# Altium footprint library Kintex_SDR.PcbLib: 72 footprints (part 5 of 5)
Each footprint in its own frame and in the unit in brackets; x right, y up, seen from the top. Pads: shape width x height; smd on the part's side, far side on the other; paste and mask are expansions set on the pad; w line width, h text height; cw(c..) or ccw(c..) is an arc to the next point about the centre after c.
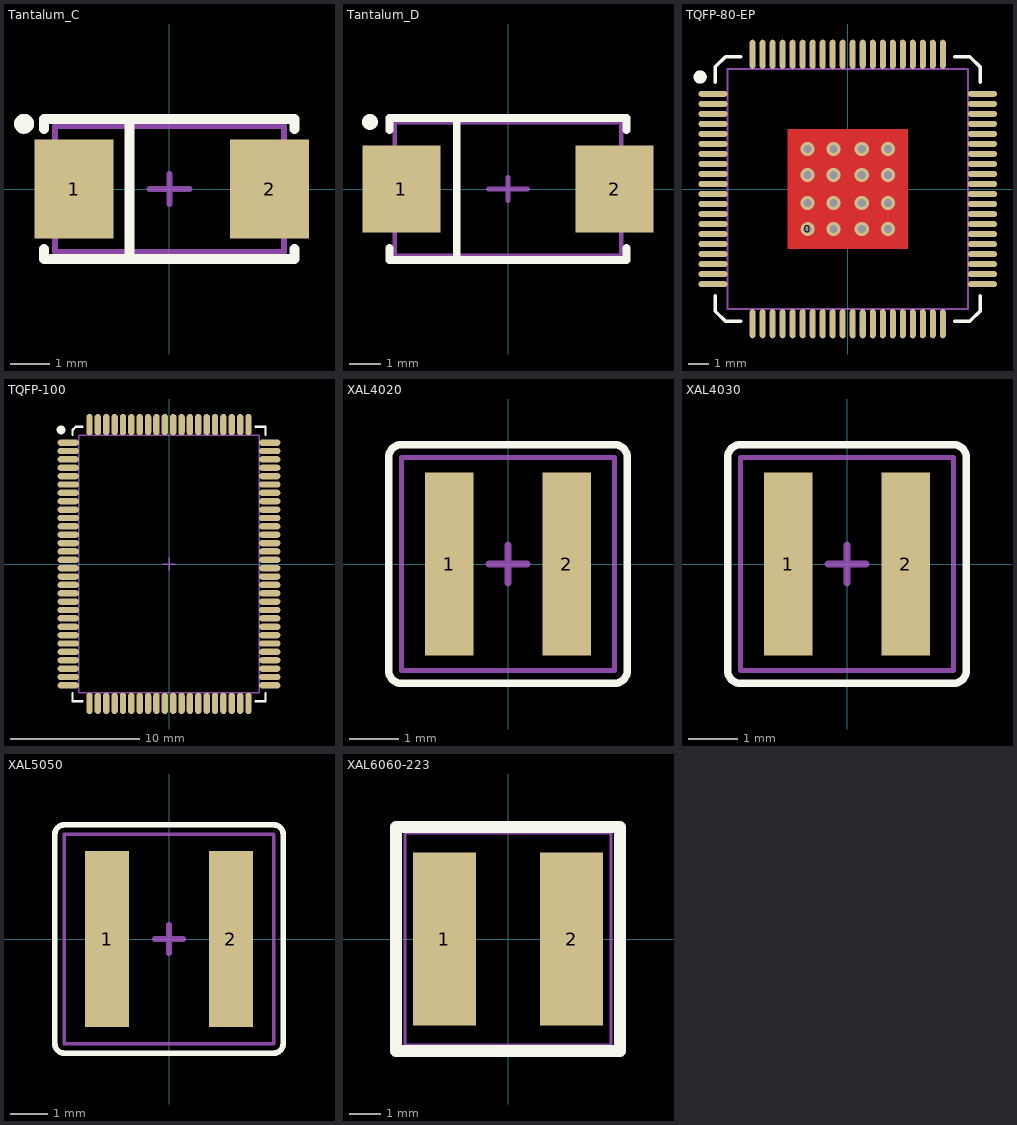
[diagram p4: the footprints below, top view; thin cyan lines are the x and y axes]

## Tantalum_C [mm]
height 2
pads (2):
  rect 2x2.5 smd: 1(-2.413,0) 2(2.54,0)
Top Overlay:
  circle w0.254: c-3.683,1.651 r0.127
  lines w0.254: -3.175,-1.524 -3.175,-1.778 3.175,-1.778 3.175,-1.524 ; -3.175,1.524 -3.175,1.778 3.175,1.778 3.175,1.524 ; -1.016,-1.651 -1.016,1.651
Mechanical 1:
  lines w0.15: -0.508,0 0.508,0 ; 0,-0.381 0,0.381 ; -2.9,-1.6 2.9,-1.6 2.9,1.6 -2.9,1.6 -2.9,-1.6
3D body "User Library-Tantalum Size C.step": height 2.6, standoff 0, extent -2.9,-1.6 2.9,1.6

## Tantalum_D [mm]
height 2
pads (2):
  rect 2.5x2.8 smd: 1(-3.429,0) 2(3.429,0)
Top Overlay:
  circle w0.254: c-4.445,2.159 r0.127
  lines w0.254: -3.81,-1.905 -3.81,-2.286 3.81,-2.286 3.81,-1.905 ; -3.81,1.905 -3.81,2.286 3.81,2.286 3.81,1.905 ; -1.651,-2.286 -1.651,2.286
Mechanical 1:
  lines w0.15: -0.635,0 0.635,0 ; 0,-0.381 0,0.381 ; -3.65,-2.15 3.65,-2.15 3.65,2.15 -3.65,2.15 -3.65,-2.15
3D body "User Library-CaseD_7343-31.step": height 2.8, standoff 0, extent -3.65,-2.15 3.65,2.15

## TQFP-80-EP [mm] "TQFP, 80-Leads"
height 1.05
pads (81):
  round 0.7 hole 0.4: 0(-2,-2)
  oval 1.45x0.3 smd: 1(-6.725,4.75) 2(-6.725,4.25) 3(-6.725,3.75) 4(-6.725,3.25) 5(-6.725,2.75) 6(-6.725,2.25) 7(-6.725,1.75) 8(-6.725,1.25) 9(-6.725,0.75) 10(-6.725,0.25) 11(-6.725,-0.25) 12(-6.725,-0.75) 13(-6.725,-1.25) 14(-6.725,-1.75) 15(-6.725,-2.25) 16(-6.725,-2.75) 17(-6.725,-3.25) 18(-6.725,-3.75) 19(-6.725,-4.25) 20(-6.725,-4.75) 41(6.725,-4.75) 42(6.725,-4.25) 43(6.725,-3.75) 44(6.725,-3.25) 45(6.725,-2.75) 46(6.725,-2.25) 47(6.725,-1.75) 48(6.725,-1.25) 49(6.725,-0.75) 50(6.725,-0.25) 51(6.725,0.25) 52(6.725,0.75) 53(6.725,1.25) 54(6.725,1.75) 55(6.725,2.25) 56(6.725,2.75) 57(6.725,3.25) 58(6.725,3.75) 59(6.725,4.25) 60(6.725,4.75)
  oval 0.3x1.45 smd: 21(-4.75,-6.725) 22(-4.25,-6.725) 23(-3.75,-6.725) 24(-3.25,-6.725) 25(-2.75,-6.725) 26(-2.25,-6.725) 27(-1.75,-6.725) 28(-1.25,-6.725) 29(-0.75,-6.725) 30(-0.25,-6.725) 31(0.25,-6.725) 32(0.75,-6.725) 33(1.25,-6.725) 34(1.75,-6.725) 35(2.25,-6.725) 36(2.75,-6.725) 37(3.25,-6.725) 38(3.75,-6.725) 39(4.25,-6.725) 40(4.75,-6.725) 61(4.75,6.725) 62(4.25,6.725) 63(3.75,6.725) 64(3.25,6.725) 65(2.75,6.725) 66(2.25,6.725) 67(1.75,6.725) 68(1.25,6.725) 69(0.75,6.725) 70(0.25,6.725) 71(-0.25,6.725) 72(-0.75,6.725) 73(-1.25,6.725) 74(-1.75,6.725) 75(-2.25,6.725) 76(-2.75,6.725) 77(-3.25,6.725) 78(-3.75,6.725) 79(-4.25,6.725) 80(-4.75,6.725)
via -2,2 diameter 0.7 hole 0.4
via -0.7,2 diameter 0.7 hole 0.4
via 0.7,2 diameter 0.7 hole 0.4
via 2,2 diameter 0.7 hole 0.4
via -2,0.7 diameter 0.7 hole 0.4
via 0.7,0.7 diameter 0.7 hole 0.4
via 2,0.7 diameter 0.7 hole 0.4
via -2,-0.7 diameter 0.7 hole 0.4
via -0.7,-0.7 diameter 0.7 hole 0.4
via 0.7,-0.7 diameter 0.7 hole 0.4
via 2,-0.7 diameter 0.7 hole 0.4
via -0.7,-2 diameter 0.7 hole 0.4
via 0.7,-2 diameter 0.7 hole 0.4
via 2,-2 diameter 0.7 hole 0.4
via -0.7,0.7 diameter 0.7 hole 0.4
Top Layer:
  rectangle: -3,-3 3,3
Top Overlay:
  circle w0.35: c-7.366,5.588 r0.156
  lines w0.178: -6.604,-5.334 -6.604,-6.096 -6.096,-6.604 -5.334,-6.604 ; -6.604,5.334 -6.604,6.096 -6.096,6.604 -5.334,6.604 ; 5.334,-6.604 6.096,-6.604 6.604,-6.096 6.604,-5.334 ; 5.334,6.604 6.096,6.604 6.604,6.096 6.604,5.334
Top Paste:
  rectangle: -2.8,0.1 -0.1,2.8
  rectangle: 0.1,0.1 2.8,2.8
  rectangle: -2.8,-2.8 -0.1,-0.1
  rectangle: 0.1,-2.8 2.8,-0.1
Mechanical 1:
  lines w0.1: -0.5,0 0.5,0 ; 0,-0.5 0,0.5
Mechanical 13:
  lines w0.1: -6,-6 -6,6 6,6 6,-6 -6,-6
3D body "User Library-QFP50P1400X1400X160-80N.step": height 1.6, standoff 0, extent -7.1,-7.1 7.1,7.1

## TQFP-100 [mm] "100-pin TQFP (14x20x1.4 mm)"
height 1.6
pads (100):
  oval 1.65x0.5 smd: 1(-7.825,9.425) 2(-7.825,8.775) 3(-7.825,8.125) 4(-7.825,7.475) 5(-7.825,6.825) 6(-7.825,6.175) 7(-7.825,5.525) 8(-7.825,4.875) 9(-7.825,4.225) 10(-7.825,3.575) 11(-7.825,2.925) 12(-7.825,2.275) 13(-7.825,1.625) 14(-7.825,0.975) 15(-7.825,0.325) 16(-7.825,-0.325) 17(-7.825,-0.975) 18(-7.825,-1.625) 19(-7.825,-2.275) 20(-7.825,-2.925) 21(-7.825,-3.575) 22(-7.825,-4.225) 23(-7.825,-4.875) 24(-7.825,-5.525) 25(-7.825,-6.175) 26(-7.825,-6.825) 27(-7.825,-7.475) 28(-7.825,-8.125) 29(-7.825,-8.775) 30(-7.825,-9.425) 51(7.825,-9.425) 52(7.825,-8.775) 53(7.825,-8.125) 54(7.825,-7.475) 55(7.825,-6.825) 56(7.825,-6.175) 57(7.825,-5.525) 58(7.825,-4.875) 59(7.825,-4.225) 60(7.825,-3.575) 61(7.825,-2.925) 62(7.825,-2.275) 63(7.825,-1.625) 64(7.825,-0.975) 65(7.825,-0.325) 66(7.825,0.325) 67(7.825,0.975) 68(7.825,1.625) 69(7.825,2.275) 70(7.825,2.925) 71(7.825,3.575) 72(7.825,4.225) 73(7.825,4.875) 74(7.825,5.525) 75(7.825,6.175) 76(7.825,6.825) 77(7.825,7.475) 78(7.825,8.125) 79(7.825,8.775) 80(7.825,9.425)
  oval 0.5x1.65 smd: 31(-6.175,-10.825) 32(-5.525,-10.825) 33(-4.875,-10.825) 34(-4.225,-10.825) 35(-3.575,-10.825) 36(-2.925,-10.825) 37(-2.275,-10.825) 38(-1.625,-10.825) 39(-0.975,-10.825) 40(-0.325,-10.825) 41(0.325,-10.825) 42(0.975,-10.825) 43(1.625,-10.825) 44(2.275,-10.825) 45(2.925,-10.825) 46(3.575,-10.825) 47(4.225,-10.825) 48(4.875,-10.825) 49(5.525,-10.825) 50(6.175,-10.825) 81(6.175,10.825) 82(5.525,10.825) 83(4.875,10.825) 84(4.225,10.825) 85(3.575,10.825) 86(2.925,10.825) 87(2.275,10.825) 88(1.625,10.825) 89(0.975,10.825) 90(0.325,10.825) 91(-0.325,10.825) 92(-0.975,10.825) 93(-1.625,10.825) 94(-2.275,10.825) 95(-2.925,10.825) 96(-3.575,10.825) 97(-4.225,10.825) 98(-4.875,10.825) 99(-5.525,10.825) 100(-6.175,10.825)
Top Overlay:
  circle w0.35: c-8.382,10.414 r0.167
  lines w0.178: -7.493,-10.033 -7.493,-10.668 -6.731,-10.668 ; -7.493,10.033 -7.493,10.414 -7.239,10.668 -6.731,10.668 ; 6.731,-10.668 7.493,-10.668 7.493,-10.033 ; 6.731,10.668 7.493,10.668 7.493,10.033
Mechanical 1:
  lines w0.1: -0.5,0 0.5,0 ; 0,-0.5 0,0.5 ; -7,-10 -7,10 7,10 7,-10 -7,-10
3D body "User Library-TQFP 100.step": height 1.48, standoff -0.02, extent -7.999,-11.013 8.001,10.962

## XAL4020 [mm]
height 10
pads (2):
  rect 0.98x3.7 smd: 1(-1.185,0) 2(1.185,0)
Top Overlay:
  lines w0.15: -2.413,-2.159 ccw(c-2.159,-2.159) -2.159,-2.413 2.159,-2.413 ccw(c2.159,-2.159) 2.413,-2.159 2.413,2.159 ccw(c2.159,2.159) 2.159,2.413 -2.159,2.413 ccw(c-2.159,2.159) -2.413,2.159 -2.413,-2.159
Mechanical 1:
  lines w0.1: -2.159,-2.159 2.159,-2.159 2.159,2.159 -2.159,2.159 -2.159,-2.159
  lines w0.15: -0.381,0 0.381,0 ; 0,-0.381 0,0.381
3D body "Coilcraft-XAL4020.step": height 2.13, standoff -0.1, extent -2.15,-2.15 2.15,2.15

## XAL4030 [mm]
height 10
pads (2):
  rect 0.98x3.7 smd: 1(-1.185,0) 2(1.185,0)
Top Overlay:
  lines w0.15: -2.413,-2.159 ccw(c-2.159,-2.159) -2.159,-2.413 2.159,-2.413 ccw(c2.159,-2.159) 2.413,-2.159 2.413,2.159 ccw(c2.159,2.159) 2.159,2.413 -2.159,2.413 ccw(c-2.159,2.159) -2.413,2.159 -2.413,-2.159
Mechanical 1:
  lines w0.1: -2.159,-2.159 2.159,-2.159 2.159,2.159 -2.159,2.159 -2.159,-2.159
  lines w0.15: -0.381,0 0.381,0 ; 0,-0.381 0,0.381
3D body "Coilcraft-XAL4030.step": height 3.13, standoff -0.1, extent -2.15,-2.15 2.15,2.15

## XAL5050 [mm]
height 10
pads (2):
  rect 1.18x4.7 smd: 1(-1.655,0) 2(1.655,0)
Top Overlay:
  lines w0.15: -3.048,-2.794 ccw(c-2.794,-2.794) -2.794,-3.048 2.794,-3.048 ccw(c2.794,-2.794) 3.048,-2.794 3.048,2.794 ccw(c2.794,2.794) 2.794,3.048 -2.794,3.048 ccw(c-2.794,2.794) -3.048,2.794 -3.048,-2.794
Mechanical 1:
  lines w0.1: -2.794,-2.794 2.794,-2.794 2.794,2.794 -2.794,2.794 -2.794,-2.794
  lines w0.15: -0.381,0 0.381,0 ; 0,-0.381 0,0.381
3D body "Coilcraft-XAL5050.step": height 5.13, standoff -0.1, extent -2.74,-2.84 2.74,2.84

## XAL6060-223 [mm]
height 10
pads (2):
  rect 2x5.5 smd: 1(-2.02,0) 2(2.02,0)
Top Overlay:
  lines w0.381: -3.556,-3.556 3.556,-3.556 3.556,3.556 -3.556,3.556 -3.556,-3.556
Mechanical 1:
  lines w0.1: -3.28,-3.38 3.28,-3.38 3.28,3.38 -3.28,3.38 -3.28,-3.38
3D body "Coilcraft-XAL6060-223.step": height 6.08, standoff -0.02, extent -3.28,-3.38 3.28,3.38